# Altium integrated library EDD.IntLib: 140 symbols (continued)
## LN5674_11_M1
designator LCD?, comment LN5674  (value not drawn)
footprint LN5674 (Footprint not found)
pins: 1 e, 2 d, 3 DP, 4 c, 5 g, 6 Digit4, 7 b, 8 Digit3, 9 Digit2, 10 f, 11 a, 12 Digit1

## M24LR04E-R
designator U?
footprint SOIC8
pins: 1 Vout, 2 AC0, 3 AC1, 4 VSS (power), 5 SDA (io), 6 SCL (in), 7 RF WIP/Busy (out), 8 VCC (power)

## MAX3232
designator U?, comment MAX3232 CONVERTER
MAX3232
footprint SOT95P280X145-6N (Footprint not found)
pins: 1 C1+ (power), 2 V+ (power), 3 C1- (power), 4 C2+ (power), 5 C2- (power), 6 V- (power), 7 DOUT2 (power), 8 RIN2 (power), 9 ROUT2 (power), 10 DIN2 (power), 11 DIN1 (power), 12 ROUT1 (power), 13 RIN1 (power), 14 DOUT1 (power), 15 GND (power), 16 VCC (power)

## MC-ARM-STM32F101-SQ144
designator U?
footprint LQFP144_N (Thin QFP, 144-Leads, Body 20x20mm, Pitch 0.5mm, IPC Medium Density)
part A pins: 1 PE2 (io), 2 PE3 (io), 3 PE4 (io), 4 PE5 (io), 5 PE6 (io), 7 PC13-TAMPER-RTC (io), 8 PC14-OSC32_IN (io), 9 PC15-OSC32_OUT (io), 10 PF0 (io), 11 PF1 (io), 12 PF2 (io), 13 PF3 (io), 14 PF4 (io), 15 PF5 (io), 18 PF6 (io), 19 PF7 (io), 20 PF8 (io), 21 PF9 (io), 22 PF10 (io), 23 OSC_IN (in), 24 OSC_OUT (out), 25 NRST (io), 26 PC0 (io), 27 PC1 (io), 28 PC2 (io), 29 PC3 (io), 34 PA0-WKUP (io), 35 PA1 (io), 36 PA2 (io), 37 PA3 (io), 40 PA4 (io), 41 PA5 (io), 42 PA6 (io), 43 PA7 (io), 44 PC4 (io), 45 PC5 (io), 46 PB0 (io), 47 PB1 (io), 48 PB2 (io), 49 PF11 (io), 50 PF12 (io), 53 PF13 (io), 54 PF14 (io), 55 PF15 (io), 56 PG0 (io), 57 PG1 (io), 58 PE7 (io), 59 PE8 (io), 60 PE9 (io), 63 PE10 (io), 64 PE11 (io), 65 PE12 (io), 66 PE13 (io), 67 PE14 (io), 68 PE15 (io), 69 PB10 (io), 70 PB11 (io), 73 PB12 (io), 74 PB13 (io), 75 PB14 (io), 76 PB15 (io), 77 PD8 (io), 78 PD9 (io), 79 PD10 (io), 80 PD11 (io), 81 PD12 (io), 82 PD13 (io), 85 PD14 (io), 86 PD15 (io), 87 PG2 (io), 88 PG3 (io), 89 PG4 (io), 90 PG5 (io), 91 PG6 (io), 92 PG7 (io), 93 PG8 (io), 96 PC6 (io), 97 PC7 (io), 98 PC8 (io), 99 PC9 (io), 100 PA8 (io), 101 PA9 (io), 102 PA10 (io), 103 PA11 (io), 104 PA12 (io), 105 PA13 (io), 109 PA14 (io), 110 PA15 (io), 111 PC10 (io), 112 PC11 (io), 113 PC12 (io), 114 PD0 (io), 115 PD1 (io), 116 PD2 (io), 117 PD3 (io), 118 PD4 (io), 119 PD5 (io), 122 PD6 (io), 123 PD7 (io), 124 PG9 (io), 125 PG10 (io), 126 PG11 (io), 127 PG12 (io), 128 PG13 (io), 129 PG14 (io), 132 PG15 (io), 133 PB3 (io), 134 PB4 (io), 135 PB5 (io), 136 PB6 (io), 137 PB7 (io), 138 BOOT0 (in), 139 PB8 (io), 140 PB9 (io), 141 PE0 (io), 142 PE1 (io)
part B pins: 6 VBAT (power), 16 VSS_5 (power), 17 VDD_5 (power), 30 VSSA (power), 31 VREF- (power), 32 VREF+ (power), 33 VDDA (power), 38 VSS_4 (power), 39 VDD_4 (power), 51 VSS_6 (power), 52 VDD_6 (power), 61 VSS_7 (power), 62 VDD_7 (power), 71 VSS_1 (power), 72 VDD_1 (power), 83 VSS_8 (power), 84 VDD_8 (power), 94 VSS_9 (power), 95 VDD_9 (power), 106 NC, 107 VSS_2 (power), 108 VDD_2 (power), 120 VSS_10 (power), 121 VDD_10 (power), 130 VSS_11 (power), 131 VDD_11 (power), 143 VSS_3 (power), 144 VDD_3 (power)

## Micro SD card holder
designator P?
LatestRevisionDate: 17-Jul-2002; LatestRevisionNote: Re-released for DXP Platform.; Publisher: Altium Limited
footprint SD 503182-077 (Footprint not found)
pins: 1 Data2, 2 Data3, 3 CMD, 4 VDD, 5 CLK, 6 VSS, 7 Data0, 8 Data1, 9 Card Detect, 10 SW Term

## MJD31C
designator Q1
ParentPart: Value; StockCode: 0605; StockCode: 0132
footprint D-PAK (Footprint not found)
pins: 1, 2, 3

## MMBT2222LT1
designator Q?
General Purpose Transistor NPN Silicon; Manufacturer: Motorola; Class: Discrete; SubClass: BJT - Low Power; Code: PPF200; Published: 29/09/2000; Publisher: Altium Hobart Technology Centre
footprint SO-G3/C2.5
pins: 1 B, 2 E, 3 C

## Multiturn Pot
designator VR?
Potentiometer; Code: 100K PIHER POT; Stock Code: PIHER; Price: 2.68
footprint Multiturn Pot (Footprint not found)
pins: 1, 2, 3 W

## NT90 Relay -SPST
designator K?, comment NT90 Relay
Single-Pole Single-Throw Relay; Published: 24-Mar-1999; Revision: July-2002: Re-released for DXP Platform.; Publisher: Altium Limited
footprint NT90 Relay (Relay 20A)
pins: 1, 2, 3, 4, 5

## PIC12LF1822-E/SN
designator U?
FLASH-Based 8-Bit CMOS Microcontroller, 10-Bit A/D, 8-Pin SOIC 150mil, Extended Temperature; Note: Refer to data sheet (DS41190F) for details of supply voltage range under different conditions.; Published: 11-Oct-2004; LatestRevisionDate: 02-Dec-2009; LatestRevisionNote: Updated to datasheet revision revF, Sep-2009.; DatasheetVersion: revF, Sep-2009; PackageVersion: revBB, Aug-2009; PackageReference: SOIC-SN8; Publisher: Altium Limited; PackageDescription: 8-Lead Plastic Small Outline (SN) - Narrow, 3.90mm Body [SOIC]; Supplier 1: Digi-Key; Supplier Part Number 1: PIC12F675-E/SN-ND; Code_JEDEC: MS-012; Code_IPC: SOIC127P600-8; ComponentLink1Description: Datasheet; ComponentLink1URL: http://ww1.microchip.com/downloads/en/DeviceDoc/41190F.pdf; ComponentLink2Description: Packaging Specification; ComponentLink2URL: http://www.microchip.com/stellent/groups/techpub_sg/documents/packagingspec/en012702.pdf; ComponentLink3Description: Microchip.com Home; ComponentLink3URL: http://www.microchip.com/
footprint SOIC8
pins: 1 VDD (power), 2 RX/DT/CCP1/P1A/SRNQ/T1CKI/T1OSI/OSC1/CLKIN/RA5 (io), 3 MDCIN2/T1G/P1B/TX/CK/SDO/CLKR/C1IN1-/T1OSO/CLKOUT/OSC2/CPS3/AN3/RA4 (io), 4 MCLR/VPP/T1G/SS/RA3 (io), 5 RA2/AN2/CPS2/C1OUT/SRQ/T0CKI/CCP1/P1A/FLT0/SDA/SDI/INT/MDCIN1 (io), 6 RA1/AN1/CPS1/VREF/C1IN0-/SRI/RX/DT/SCL/SCK/MDMIN/ICSPCLK (io), 7 RA0/AN0/CPS0/C1IN+/DACOUT/TX/CK/SDO/SS/P1B/MDOUT/ICSPDAT (io), 8 VSS (power)

## PIC16LF1823-E/SN
designator U?
footprint SOIC14 (Footprint not found)
pins: 1 VDD, 2 T1CKI/T1OSI/OSC1/CLKIN/RA5, 3 T1G(1)/SDO(1)/CLKR/T1OSO/CLKOUT/OSC2/CPS3/AN3/RA4, 4 MCLR/VPP/T1G(1)/SS(1)/RA3, 5 MDCIN2/RX(1)/DT(1)/CCP1/P1A/RC5, 6 MDOUT/TX(1)/CK(1)/P1B/SRNQ/C2OUT/RC4, 7 MDMIN/SS(1)/P1C/C12IN3-/CPS7/AN7/RC3, 8 RC2/AN6/CPS6/C12IN2-/P1D/SDO(1)/MDCIN1, 9 RC1/AN5/CPS5/C12IN1-/SDA/SDI, 10 RC0/AN4/CPS4/C2IN+/SCL/SCK, 11 RA2/AN2/CPS2/T0CKI/INT/C1OUT/SRQ/FLT0, 12 RA1/AN1/CPS1/C12IN0-/VREF/SRI/RX(1)/DT(1)/ICSPCLK, 13 RA0/AN0/CPS0/C1IN+/DACOUT/TX(1)/CK(1)/ICSPDAT/ICDDAT, 14 VSS

## PM-BM-MCP73831-SOT5
designator U?
pins: 1 STAT (out), 2 VSS (power), 3 VBAT (power), 4 VDD (power), 5 PROG

## PM-SWREG-STLD40D-IL9
designator U?
footprint QFN8_V (SON, 8-Leads, Body 3x3mm, Pitch 0.65mm, Thermal Pad 2.74x2mm, ST Recommended)
pins: 1 VI (power), 2 RSET (in), 3 GND (power), 4 FB, 5 NC, 6 VO (out), 7 EN (in), 8 SW (oc), 9 PGND (power)

## POT 3224 SMT Bourns
designator VR?, comment 100k
Potentiometer; Code: DNF
footprint POT 3224 SMD (Bourns SMD POT)
pins: 1, 2, 3

## PT10NH05
designator VR4, comment 100K PIHER POT
Potentiometer; Stock Code: PIHER; Price: 2.68; Code: 100K PIHER POT
footprint PT10NH01 (PT10 Piher Pot)
pins: 1, 2, 3 W

## PT15NH05
designator VR4, comment 100K PIHER POT
Potentiometer; Stock Code: PIHER; Price: 2.68; Code: 100K PIHER POT
footprint PT15NH05 (Footprint not found)
pins: 1, 2, 3 W

## Res2
designator R?, comment 1k2
Resistor; Code: BLC250; Published: 8-Jun-2000; Revision: July-2002: Re-released for DXP Platform.; Publisher: Altium Limited
footprint AXIAL-0.4 (Axial Device, Thru-Hole; 2 Leads; 0.4 in Pin Spacing)
footprint 0603
footprint 1206
footprint AXIAL-0.8 (Footprint not found)
footprint AXIAL-0.6 (Footprint not found)
footprint RESC0402(1005)_L (Chip Resistor, Body 1.0x0.5mm, IPC High Density)
footprint 1206d
pins: 1, 2
1 alternate drawing of the same symbol

## Res Varistor
designator RV?, comment DNF
Varistor (Voltage-Sensitive Resistor); Published: 24-Mar-1999; LatestRevisionDate: 4-Mar-2005; LatestRevisionNote: PCB Footprint replaced.; Publisher: Altium Limited; Code: DNF
footprint 4527
pins: 1, 2

## Resonator CSTCC-G
designator RS1
footprint CSTCC-G Resonator (SMD Resonator)
pins: 1, 2 GND (power), 3

## Resonator ZTTCS MX
designator RS1
footprint Resonator ZTTCS MX (SMD Resonator)
pins: 1, 2 GND (power), 3

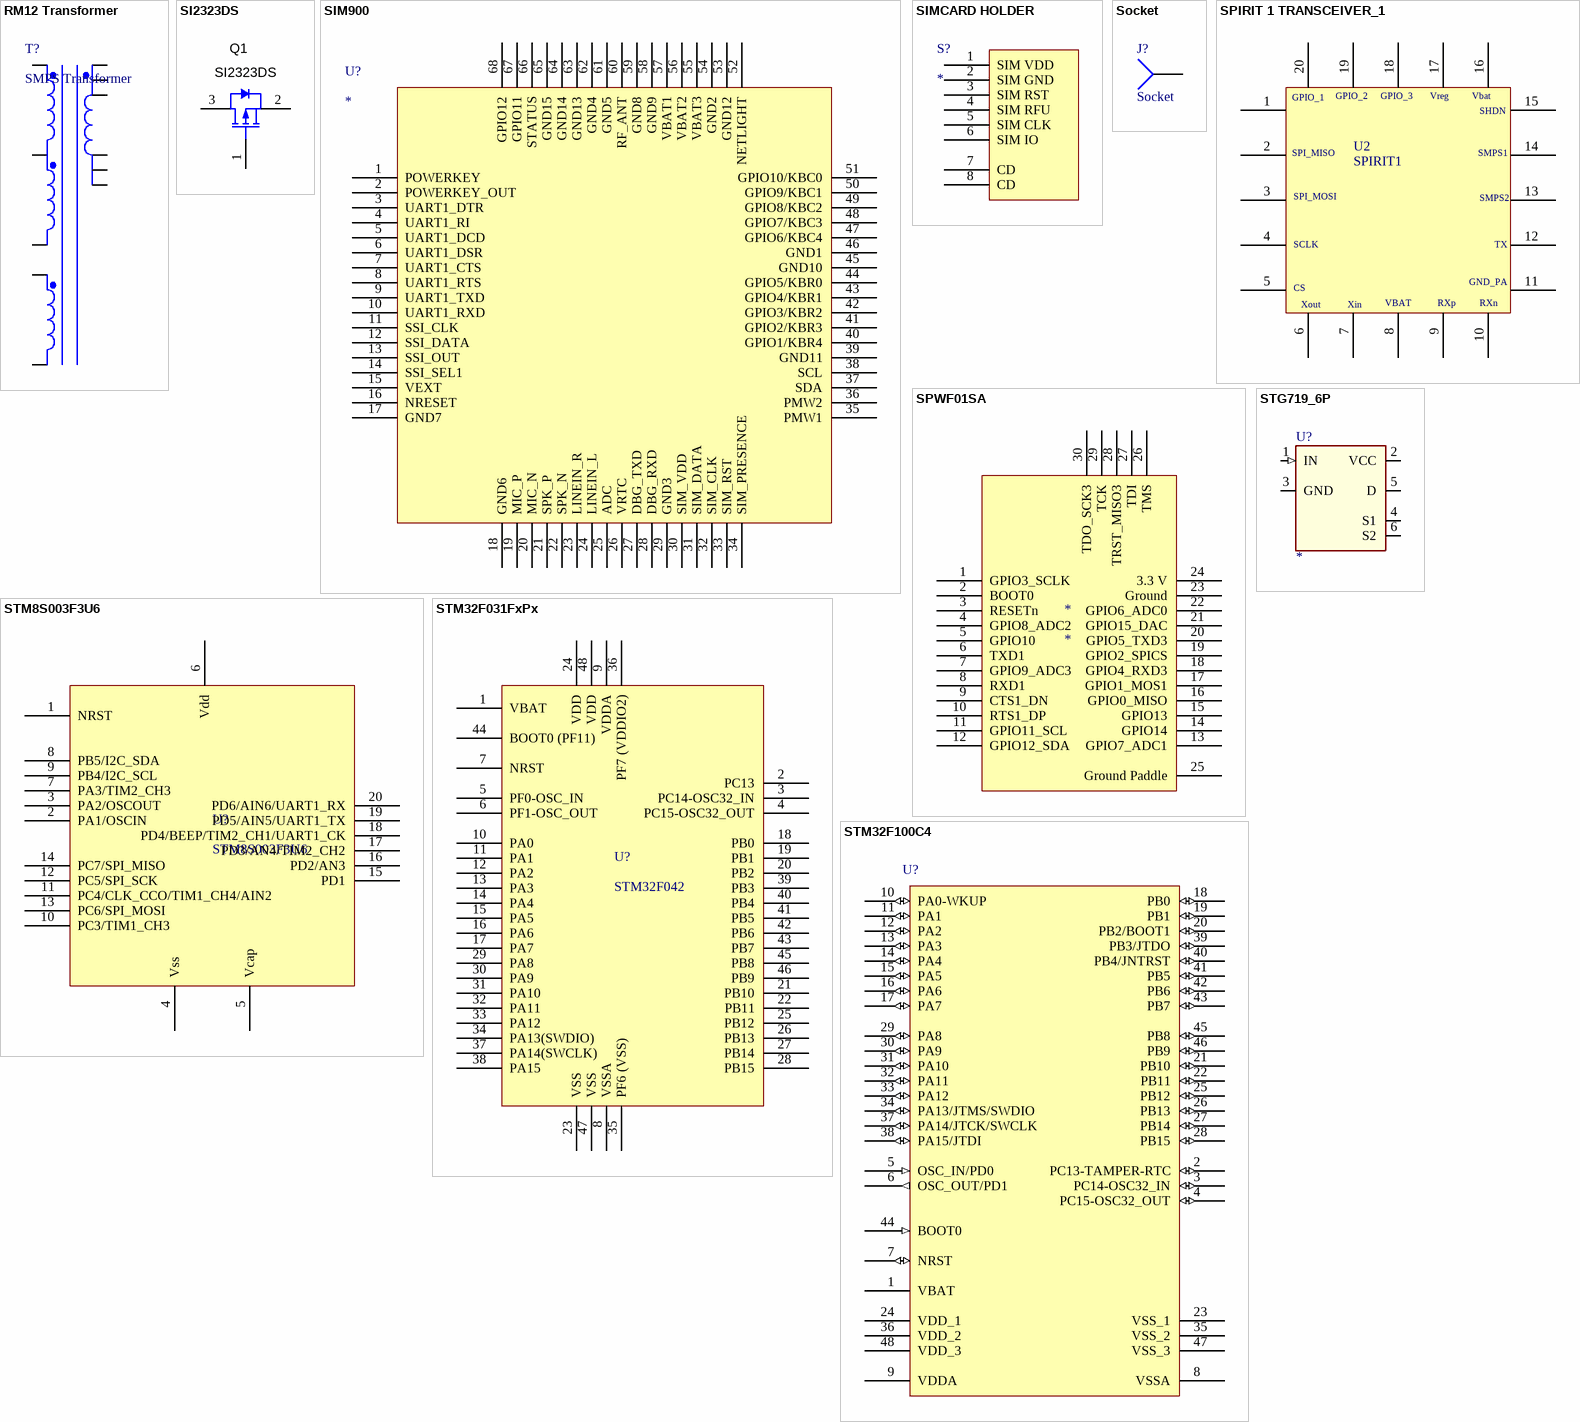
[diagram p3: symbols RM12 Transformer to STM32F100C4]

## RM12 Transformer
designator T?, comment SMPS Transformer
RM12 transformer
footprint RM12 Transformer
pins: 1 Pri-, 2 Pri-, 3 Pri+, 4 Sec-, 5 Sec-, 6 Sec-, 7 Sec+, 8 Sec+, 9 Sec+, 11 Aux+, 12 Aux-

## SI2323DS
designator Q1
MOSFET, P-CH, -20 V, -3.7 A, SOT-23; Manufacturer: Vishay-Siliconix; Alternate Manufacturer: None; U/M: EA; ChType: P; Value: -20V; Value1: 0.031 ohm; Rdson45_ohm: 0.031; Value2: 12.5 nC; QgTyp_nC: 12.5; Vgs_V: -8; AEC Category: Q101; SymbolVersion: 2008-07-09; PartNumber: SI2323DS; PackageReference: SOT-23; CompType: MOSFET; VdsMax_V: -20; IdsMax_A: -3.7; RoHS: Y; MountType: SMT; Published: 2008-06-19; Publisher: Texas Instruments; LatestRevisionDate: 2015-11-11; LatestRevisionNote: Added parts.; ComponentLink1Description: Datasheet link; ComponentLink1URL: http://www.vishay.com/docs/72024/72024.pdf; AEC Qualified: ?
footprint SOT-23
footprint SOT-23M
footprint SOT-23L
simulation model Si2323DS
footprint SOT-23 (SOT23, 3-Leads, Body 2.9x1.3mm, Pitch 0.95mm, Lead Span 2.5mm, IPC Medium Density)
pins: 1 G, 2 S, 3 D

## SIM900
designator U?
footprint SIM900 (Footprint not found)
pins: 1 POWERKEY, 2 POWERKEY_OUT, 3 UART1_DTR, 4 UART1_RI, 5 UART1_DCD, 6 UART1_DSR, 7 UART1_CTS, 8 UART1_RTS, 9 UART1_TXD, 10 UART1_RXD, 11 SSI_CLK, 12 SSI_DATA, 13 SSI_OUT, 14 SSI_SEL1, 15 VEXT, 16 NRESET, 17 GND7, 18 GND6, 19 MIC_P, 20 MIC_N, 21 SPK_P, 22 SPK_N, 23 LINEIN_R, 24 LINEIN_L, 25 ADC, 26 VRTC, 27 DBG_TXD, 28 DBG_RXD, 29 GND3, 30 SIM_VDD, 31 SIM_DATA, 32 SIM_CLK, 33 SIM_RST, 34 SIM_PRESENCE, 35 PMW1, 36 PMW2, 37 SDA, 38 SCL, 39 GND11, 40 GPIO1/KBR4, 41 GPIO2/KBR3, 42 GPIO3/KBR2, 43 GPIO4/KBR1, 44 GPIO5/KBR0, 45 GND10, 46 GND1, 47 GPIO6/KBC4, 48 GPIO7/KBC3, 49 GPIO8/KBC2, 50 GPIO9/KBC1, 51 GPIO10/KBC0, 52 NETLIGHT, 53 GND12, 54 GND2, 55 VBAT3, 56 VBAT2, 57 VBAT1, 58 GND9, 59 GND8, 60 RF_ANT, 61 GND5, 62 GND4, 63 GND13, 64 GND14, 65 GND15, 66 STATUS, 67 GPIO11, 68 GPIO12

## SIMCARD HOLDER
designator S?
footprint SIMCARD HOLDER (Footprint not found)
pins: 1 SIM VDD, 2 SIM GND, 3 SIM RST, 4 SIM RFU, 5 SIM CLK, 6 SIM IO, 7 CD, 8 CD

## Socket
designator J?
LatestRevisionDate: 17-Jul-2002; LatestRevisionNote: Re-released for DXP Platform.; Publisher: Altium Limited; Code: Socket
footprint PIN1 (Connector; Socket)
signal-integrity model Connector
pins: 1

## SPIRIT 1 TRANSCEIVER_1
designator U2, comment SPIRIT1
Low data rate, low power Sub 1GHz transceiver
footprint QFN50P400X400X100_HS-21N (QFN, 20-Leads, Body 4.00x4.00mm, Pitch 0.50mm, Thermal Pad 2.60x2.60mm, IPC Medium Density)
pins: 1 GPIO_0, 2 GPIO_1, 3 GPIO_2, 4 GPIO_3, 5 GPIO_3, 6 VREG, 7 VREG, 8 VREG, 9 VREG, 10 VREG, 11 TX, 12 TX, 13 TX, 14 TX, 15 TX, 16 VBAT2, 17 VBAT2, 18 VBAT2, 19 VBAT2, 20 VBAT2, 21 hidden to GND
text: Vreg; Vbat; SHDN; SPI_MISO; SMPS1; SPI_MOSI; SMPS2; SCLK; GND_PA; CS; Xout; Xin; VBAT; RXp; RXn

## SPWF01SA
designator *
footprint SPWF01SA (Serial to WiFI Module)
pins: 1 GPIO3_SCLK, 2 BOOT0, 3 RESETn, 4 GPIO8_ADC2, 5 GPIO10, 6 TXD1, 7 GPIO9_ADC3, 8 RXD1, 9 CTS1_DN, 10 RTS1_DP, 11 GPIO11_SCL, 12 GPIO12_SDA, 13 GPIO7_ADC1, 14 GPIO14, 15 GPIO13, 16 GPIO0_MISO, 17 GPIO1_MOS1, 18 GPIO4_RXD3, 19 GPIO2_SPICS, 20 GPIO5_TXD3, 21 GPIO15_DAC, 22 GPIO6_ADC0, 23 Ground, 24 3.3 V, 25 Ground Paddle, 26 TMS, 27 TDI, 28 TRST_MISO3, 29 TCK, 30 TDO_SCK3

## STG719_6P
designator U?
footprint SOT95P280X145-6N (Footprint not found)
pins: 1 IN (in), 2 VCC (power), 3 GND (power), 4 S1 (io), 5 D (io), 6 S2 (io)

## STM8S003F3U6
designator U?
footprint QFN50P300X300X55-20L (Footprint not found)
pins: 1 NRST, 2 PA1/OSCIN, 3 PA2/OSCOUT, 4 Vss, 5 Vcap, 6 Vdd, 7 PA3/TIM2_CH3, 8 PB5/I2C_SDA, 9 PB4/I2C_SCL, 10 PC3/TIM1_CH3, 11 PC4/CLK_CCO/TIM1_CH4/AIN2, 12 PC5/SPI_SCK, 13 PC6/SPI_MOSI, 14 PC7/SPI_MISO, 15 PD1, 16 PD2/AN3, 17 PD3/AN4/TIM2_CH2, 18 PD4/BEEP/TIM2_CH1/UART1_CK, 19 PD5/AIN5/UART1_TX, 20 PD6/AIN6/UART1_RX

## STM32F031FxPx
designator U?, comment STM32F042
ARM®-based 32-bit MCU, up to 32 KB Flash
footprint LQFP48_M (Thin QFP, 48-Leads, Body 7x7mm, Pitch 0.5mm, IPC Low Density)
pins: 1 VBAT, 2 PC13, 3 PC14-OSC32_IN, 4 PC15-OSC32_OUT, 5 PF0-OSC_IN, 6 PF1-OSC_OUT, 7 NRST, 8 VSSA, 9 VDDA, 10 PA0, 11 PA1, 12 PA2, 13 PA3, 14 PA4, 15 PA5, 16 PA6, 17 PA7, 18 PB0, 19 PB1, 20 PB2, 21 PB10, 22 PB11, 23 VSS, 24 VDD, 25 PB12, 26 PB13, 27 PB14, 28 PB15, 29 PA8, 30 PA9, 31 PA10, 32 PA11, 33 PA12, 34 PA13(SWDIO), 35 PF6 (VSS), 36 PF7 (VDDIO2), 37 PA14(SWCLK), 38 PA15, 39 PB3, 40 PB4, 41 PB5, 42 PB6, 43 PB7, 44 BOOT0 (PF11), 45 PB8, 46 PB9, 47 VSS, 48 VDD

## STM32F100C4
designator U?
STM32 ARM-based 32-bit MCU with 32 Kbytes Flash, 48-pin LQFP, Industrial Temperature; Published: 30-May-2008; DatasheetVersion: rev6, Mar-2008; PackageVersion: Mar-2008; PackageReference: LQFP48; Publisher: Altium Limited; PackageDescription: 48-Pin Low-Profile Quad Flat Pack, 7 x 7 mm Body, 0.5 mm Pitch (LQFP48); ComponentLink1Description: Manufacturer Link; ComponentLink1URL: www.st.com/stm32; ComponentLink2Description: Datasheet; ComponentLink2URL: http://www.st.com/stonline/products/literature/ds/13586.pdf
footprint LQFP48_N (Thin QFP, 48-Leads, Body 7x7mm, Pitch 0.5mm, IPC Medium Density)
footprint LQFP48_L (Thin QFP, 48-Leads, Body 7x7mm, Pitch 0.5mm, IPC High Density)
footprint LQFP48_M (Thin QFP, 48-Leads, Body 7x7mm, Pitch 0.5mm, IPC Low Density)
pins: 1 VBAT (power), 2 PC13-TAMPER-RTC (io), 3 PC14-OSC32_IN (io), 4 PC15-OSC32_OUT (io), 5 OSC_IN/PD0 (in), 6 OSC_OUT/PD1 (out), 7 NRST (io), 8 VSSA (power), 9 VDDA (power), 10 PA0-WKUP (io), 11 PA1 (io), 12 PA2 (io), 13 PA3 (io), 14 PA4 (io), 15 PA5 (io), 16 PA6 (io), 17 PA7 (io), 18 PB0 (io), 19 PB1 (io), 20 PB2/BOOT1 (io), 21 PB10 (io), 22 PB11 (io), 23 VSS_1 (power), 24 VDD_1 (power), 25 PB12 (io), 26 PB13 (io), 27 PB14 (io), 28 PB15 (io), 29 PA8 (io), 30 PA9 (io), 31 PA10 (io), 32 PA11 (io), 33 PA12 (io), 34 PA13/JTMS/SWDIO (io), 35 VSS_2 (power), 36 VDD_2 (power), 37 PA14/JTCK/SWCLK (io), 38 PA15/JTDI (io), 39 PB3/JTDO (io), 40 PB4/JNTRST (io), 41 PB5 (io), 42 PB6 (io), 43 PB7 (io), 44 BOOT0 (in), 45 PB8 (io), 46 PB9 (io), 47 VSS_3 (power), 48 VDD_3 (power)

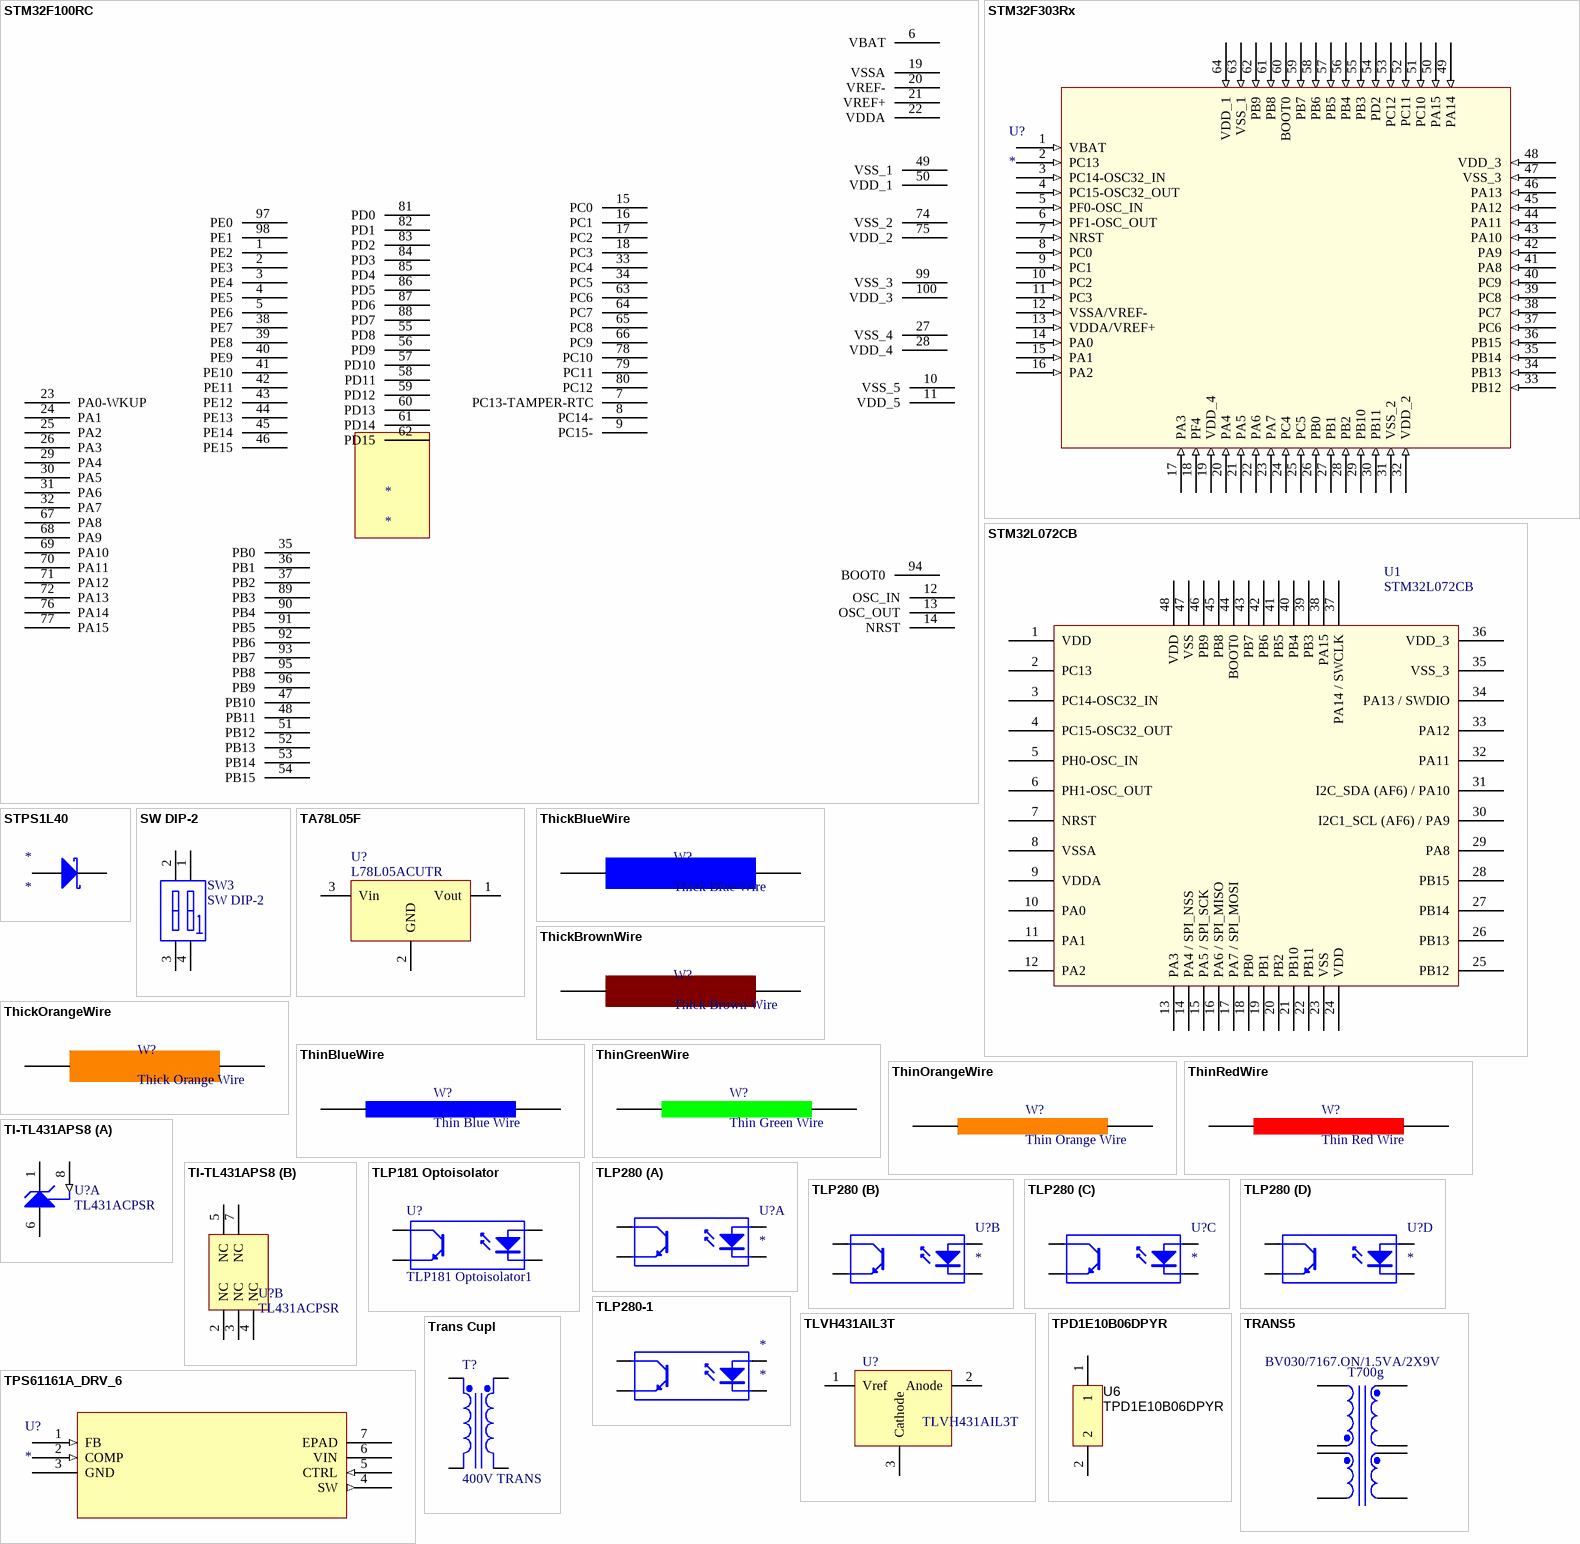
[diagram p4: symbols STM32F100RC to Trans Cupl]

## STM32F100RC
designator *
pins: 1 PE2, 2 PE3, 3 PE4, 4 PE5, 5 PE6, 6 VBAT, 7 PC13-TAMPER-RTC, 8 PC14-, 9 PC15-, 10 VSS_5, 11 VDD_5, 12 OSC_IN, 13 OSC_OUT, 14 NRST, 15 PC0, 16 PC1, 17 PC2, 18 PC3, 19 VSSA, 20 VREF-, 21 VREF+, 22 VDDA, 23 PA0-WKUP, 24 PA1, 25 PA2, 26 PA3, 27 VSS_4, 28 VDD_4, 29 PA4, 30 PA5, 31 PA6, 32 PA7, 33 PC4, 34 PC5, 35 PB0, 36 PB1, 37 PB2, 38 PE7, 39 PE8, 40 PE9, 41 PE10, 42 PE11, 43 PE12, 44 PE13, 45 PE14, 46 PE15, 47 PB10, 48 PB11, 49 VSS_1, 50 VDD_1, 51 PB12, 52 PB13, 53 PB14, 54 PB15, 55 PD8, 56 PD9, 57 PD10, 58 PD11, 59 PD12, 60 PD13, 61 PD14, 62 PD15, 63 PC6, 64 PC7, 65 PC8, 66 PC9, 67 PA8, 68 PA9, 69 PA10, 70 PA11, 71 PA12, 72 PA13, 74 VSS_2, 75 VDD_2, 76 PA14, 77 PA15, 78 PC10, 79 PC11, 80 PC12, 81 PD0, 82 PD1, 83 PD2, 84 PD3, 85 PD4, 86 PD5, 87 PD6, 88 PD7, 89 PB3, 90 PB4, 91 PB5, 92 PB6, 93 PB7, 94 BOOT0, 95 PB8, 96 PB9, 97 PE0, 98 PE1, 99 VSS_3, 100 VDD_3

## STM32F303Rx
designator U?
footprint TSQFP50P1200X1200X160-64N (TSQFP, 64-Leads, Body 10.00x10.00mm, Pitch 0.50mm, IPC Medium Density)
pins: 1 VBAT (in), 2 PC13 (in), 3 PC14-OSC32_IN (in), 4 PC15-OSC32_OUT (in), 5 PF0-OSC_IN (in), 6 PF1-OSC_OUT (in), 7 NRST (in), 8 PC0 (in), 9 PC1 (in), 10 PC2 (in), 11 PC3 (in), 12 VSSA/VREF- (in), 13 VDDA/VREF+ (in), 14 PA0 (in), 15 PA1 (in), 16 PA2 (in), 17 PA3 (in), 18 PF4 (in), 19 VDD_4 (in), 20 PA4 (in), 21 PA5 (in), 22 PA6 (in), 23 PA7 (in), 24 PC4 (in), 25 PC5 (in), 26 PB0 (in), 27 PB1 (in), 28 PB2 (in), 29 PB10 (in), 30 PB11 (in), 31 VSS_2 (in), 32 VDD_2 (in), 33 PB12 (in), 34 PB13 (in), 35 PB14 (in), 36 PB15 (in), 37 PC6 (in), 38 PC7 (in), 39 PC8 (in), 40 PC9 (in), 41 PA8 (in), 42 PA9 (in), 43 PA10 (in), 44 PA11 (in), 45 PA12 (in), 46 PA13 (in), 47 VSS_3 (in), 48 VDD_3 (in), 49 PA14 (in), 50 PA15 (in), 51 PC10 (in), 52 PC11 (in), 53 PC12 (in), 54 PD2 (in), 55 PB3 (in), 56 PB4 (in), 57 PB5 (in), 58 PB6 (in), 59 PB7 (in), 60 BOOT0 (in), 61 PB8 (in), 62 PB9 (in), 63 VSS_1 (in), 64 VDD_1 (in)

## STM32L072CB
designator U1
footprint LQFP48_M (Thin QFP, 48-Leads, Body 7x7mm, Pitch 0.5mm, IPC Low Density)
pins: 1 VDD, 2 PC13, 3 PC14-OSC32_IN, 4 PC15-OSC32_OUT, 5 PH0-OSC_IN, 6 PH1-OSC_OUT, 7 NRST, 8 VSSA, 9 VDDA, 10 PA0, 11 PA1, 12 PA2, 13 PA3, 14 PA4 / SPI_NSS, 15 PA5 / SPI_SCK, 16 PA6 / SPI_MISO, 17 PA7 / SPI_MOSI, 18 PB0, 19 PB1, 20 PB2, 21 PB10, 22 PB11, 23 VSS, 24 VDD, 25 PB12, 26 PB13, 27 PB14, 28 PB15, 29 PA8, 30 I2C1_SCL (AF6) / PA9, 31 I2C_SDA (AF6) / PA10, 32 PA11, 33 PA12, 34 PA13 / SWDIO, 35 VSS_3, 36 VDD_3, 37 PA14 / SWCLK, 38 PA15, 39 PB3, 40 PB4, 41 PB5, 42 PB6, 43 PB7, 44 BOOT0, 45 PB8, 46 PB9, 47 VSS, 48 VDD

## STPS1L40
designator *
footprint STmite flat
footprint SMA (Molded Diode, 2-Leads, Body 5.07x2.57mm, IPC High Density)
pins: 1 A, 2 K

## SW DIP-2
designator SW3
DIP Switch; Code: EFB180; Stock Code: EFB180; Price: 2.26
footprint SW-DIP4 (Two way Piano Dip switch)
pins: 1 A1, 2 A2, 3 B2, 4 B1

## TA78L05F
designator U?, comment L78L05ACUTR
Surface mount regulator; Code: RPT100
footprint SOT89
footprint TO-220-AB (TO, Thru-Hole, Vertical, Heatsink Mounted; 3 In-Line Leads; Pitch 2.54 mm)
pins: 1 Vout, 2 GND, 3 Vin

## ThickBlueWire
designator W?, comment Thick Blue Wire  (mechanical)

## ThickBrownWire
designator W?, comment Thick Brown Wire  (net tie)

## ThickOrangeWire
designator W?, comment Thick Orange Wire  (net tie)

## ThinBlueWire
designator W?, comment Thin Blue Wire  (net tie)

## ThinGreenWire
designator W?, comment Thin Green Wire  (net tie)

## ThinOrangeWire
designator W?, comment Thin Orange Wire  (net tie)

## ThinRedWire
designator W?, comment Thin Red Wire  (mechanical)

## TI-TL431APS8
designator U?, comment TL431ACPSR
Adjustable Precision Shunt Regulator, 34 ppm / degC, 100 mA, 0 to 70 degC, 8-pin SO (PS), Green (RoHS & no Sb/Br); Manufacturer: Texas Instruments; Temp Coeff(Typ)(ppm/ degree C): 34; Temp Coeff(Max)(ppm/ degree C): 92; VO Adj(Min)(V): 2.495; VO Adj(Max)(V): 36; Initial Accuracy @ 25/deg C(%): 1; Min Iz for Regulation(uA): 600; Rating: Catalog; SubFamily: Shunt Voltage Reference; Iout/Iz(Max)(mA): 100; PartNumber: TL431ACPSR; Eco-Plan: Green (RoHS & no Sb/Br); ComponentLink2Description: Datasheet; PackageDescription: 8-Pin Plastic Small Outline, Body 6.2 x 5.3 mm, 1.27 mm Pitch; ComponentLink1URL: http://www.ti.com/; PackageReference: PS8; Mounting Technology: Surface Mount; ComponentLink2URL: http://www.ti.com/general/docs/lit/getliterature.tsp?genericPartNumber=TL431A&fileType=pdf; ComponentLink1Description: Manufacturer URL; ComponentLink3URL: http://www.ti.com/litv/pdf/msop001a; ComponentLink3Description: Package Specification; DatasheetVersion: SLVS543M
footprint SOIC8
part A pins: 1 CATHODE, 6 ANODE, 8 REF (in)
part B pins: 2 NC "No internal connection", 3 NC "No internal connection", 4 NC "No internal connection", 5 NC "No internal connection", 7 NC "No internal connection"

## TLP181 Optoisolator
designator U?, comment TLP181 Optoisolator1
4-Pin Phototransistor Optocoupler TOSHIBA; Unit P: 1.20; Published: 24-Mar-1999; LatestRevisionDate: 4-Mar-2005; LatestRevisionNote: Sch pins 3 & 4 Swapped.; DatasheetDocument: Nov-2003; PackageReference: DIP-4; Publisher: Altium Limited; Supplier1 code: 35M0233; Supplier1: Mantech
footprint DIP-4 (DIP; 4 Leads; Row Spacing 7.62 mm; Pitch 2.54 mm)
footprint TLP181
pins: 1 A "Anode", 2 K "Cathode", 3 E "Emitter", 4 C "Collector"

## TLP280
designator U?
footprint SOIC127P690X210-16N (Footprint not found)
part A pins: 1 A "Anode", 2 K "Cathode", 15 E "Emitter", 16 C "Collector"
part B pins: 3 A "Anode", 4 K "Cathode", 13 E "Emitter", 14 C "Collector"
part C pins: 5 A "Anode", 6 K "Cathode", 11 E "Emitter", 12 C "Collector"
part D pins: 7 A "Anode", 8 K "Cathode", 9 E "Emitter", 10 C "Collector"

## TLP280-1
designator *
footprint SOIC127P690X210-4N (SOIC, 4-Leads, Body 2.25x4.40mm, Pitch 1.27mm, IPC Medium Density)
pins: 1 A "Anode", 2 K "Cathode", 3 E "Emitter", 4 C "Collector"

## TLVH431AIL3T
designator U?
2.5V Voltage Reference, 3-Pin SOT-23, Industrial Temperature, Tape and Reel; Published: 29-Jan-2009; DatasheetVersion: revB, Feb-2005; PackageVersion: revAW, Oct-2008; PackageReference: SOT-23-TT3; Publisher: Altium Limited; PackageDescription: 3-Lead Plastic Small Outline Transistor (TT) [SOT-23]; Code_IPC: SOT23-3; ComponentLink1Description: Manufacturer Link; ComponentLink1URL: http://www.microchip.com; ComponentLink2Description: Datasheet; ComponentLink2URL: http://ww1.microchip.com/downloads/en/DeviceDoc/21653b.pdf; ComponentLink3Description: Packaging Specification; ComponentLink3URL: http://ww1.microchip.com/downloads/en/PackagingSpec/00049AW.pdf
footprint SO-G3/C2.5
pins: 1 Vref (power), 2 Anode (power), 3 Cathode (power)

## TPD1E10B06DPYR
designator U6
ESD in 0402 Package with 10 pF Capacitance and 6 V Breakdown, 1 Channel, -40 to +125 degC, 2-pin X2SON (DPY), Green (RoHS & no Sb/Br); Manufacturer: Texas Instruments; Alternate Manufacturer: None; Alternate PartNumber: Equivalent; Breakdown Voltage(Min)(V): 6; Eco-Plan: TBD; IEC 61000-4-2 Air-Gap(+/- kV): 30; IO Capacitance(Typ)(pF): 10; SubFamily: ESD Solution; DatasheetVersion: SLLSEB1; PackageVersion: revA, Apr-2010; PackageReference: DPY0002A; PackageDescription: 2-Pin Plastic Small Outline No-Lead 1.0 x 0.6 x 0.4 mm Body; Supplier 1: Digi-Key; Supplier Part Number 1: 296-30406-2-ND; Supplier 2: Digi-Key; Supplier Part Number 2: 296-30406-1-ND; Supplier 3: Digi-Key; Supplier Part Number 3: 296-30406-6-ND; Supplier 4: Newark; Supplier Part Number 4: 94T1842; Supplier 5: Mouser; Supplier Part Number 5: 595-TPD1E10B06DPYR; IEC 61000-4-2 Contact(+/- kV): 30; IO Leakage Current(nA): 10; MountType: SMT; PartNumber: TPD1E10B06DPYR; ComponentLink1Description: Datasheet; ComponentLink1URL: http://www.ti.com/general/docs/lit/getliterature.tsp?genericPartNumber=TPD1E10B06&fileType=pdf; ComponentLink2Description: URL Link1; ComponentLink2URL: SamplesURL:http://www.ti.com/product/tpd1e10b06#samples
footprint DPY0002A (R-PX2SON-N2)
pins: 1, 2

## TPS61161A_DRV_6
designator U?
Imported; MANUFACTURER_PART_NUMBER: tps61161a_drv_6; GENERIC_PART_NUMBER: TPS61161A; VENDOR: Texas Instruments; PACKAGE_DESIGNATOR: DRV; PIN_COUNT: 6; FAMILY_NAME: WHITE LED DRIVER; INDUSTRY_STD_PKG_TYPE: SON; Datasheet URL: http://www.ti.com/lit/gpn/TPS61161A; Manufacturer: Texas Instruments
footprint DRV6_1P6X1
pins: 1 FB (in), 2 COMP (in), 3 GND (power), 4 SW (out), 5 CTRL (in), 6 VIN (power), 7 EPAD

## TRANS5
designator T700g, comment BV030/7167.ON/1.5VA/2X9V
PartCategory: B; Code: CAF270; Company Code: 0803; Long Description: TRAFO/1.5VA/2X9V/83MA/EI30/12.5; AlternateKey2: CAF197; ProductClass: SR1; BulkIssueFlag: N; WarehouseToUse: A; Unit P: 13.8; Type: CON; Designator: T?; Price: 12.9; Part Number: BV030/7167.ON/1.5VA/2X9V; StockUom: EA; PriceCatewgory: A; Supplier1: AVNET; Supplier1 Code: CAF197; Pin Count: 6; Footprint: TRF_EI30_2; Value: BV030/7167.ON/1.5VA/2X9V; PackageReference: TRF_EI30_2
footprint TRF_EI30_2
footprint SMPS35 12
pins: 1, 2, 3, 4, 5, 6, 7, 8

## Trans Cupl
designator T?, comment 400V TRANS
Transformer (Coupled Inductor Model); Code: CAF270; Published: 8-Jun-2000; LatestRevisionDate: 17-Jul-2002; LatestRevisionNote: Re-released for DXP Platform.; Publisher: Altium Limited
footprint TRF_EI30_1
simulation model TRANSFORMER (Transformer)
pins: 1 Pri+, 2 Pri-, 3 Sec-, 4 Sec+

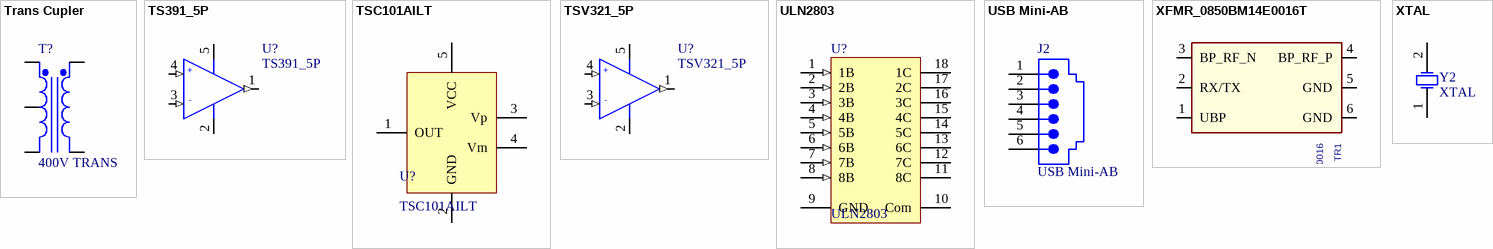
[diagram p5: symbols Trans Cupler to XTAL]

## Trans Cupler
designator T?, comment 400V TRANS
Transformer (Coupled Inductor Model); Code: CAF270; Published: 8-Jun-2000; LatestRevisionDate: 17-Jul-2002; LatestRevisionNote: Re-released for DXP Platform.; Publisher: Altium Limited
footprint ef12.6
simulation model TRANSFORMER (Transformer)
pins: 1 Pri1, 2 Pri2, 3 Pri3, 4 Sec3, 6 Sec1

## TS391_5P
designator U?
footprint SOT323-5L (SOT23, 6-Leads, Body 2.2x2.4mm (max), Pitch 0.65mm, IPC Medium Density)
footprint SOT95P280X145-5N (Footprint not found)
pins: 1 OUT (out), 2 VCC- (power), 3 -IN (in), 4 +IN (in), 5 VCC+ (power)
text: +; -

## TSC101AILT
designator U?
footprint SOT323-5L (SOT23, 6-Leads, Body 2.2x2.4mm (max), Pitch 0.65mm, IPC Medium Density)
footprint SOT95P280X145-5N (SOT23, 5-Leads, Body 2.90x2.80mm, Pitch 0.95mm, IPC Medium Density)
pins: 1 OUT, 2 GND, 3 Vp, 4 Vm, 5 VCC

## TSV321_5P
designator U?
footprint SOT323-5L (SOT23, 6-Leads, Body 2.2x2.4mm (max), Pitch 0.65mm, IPC Medium Density)
footprint SOT95P280X145-5N (Footprint not found)
pins: 1 OUT (out), 2 VCC- (power), 3 -IN (in), 4 +IN (in), 5 VCC+ (power)
text: +; -

## ULN2803
designator U?
High-Voltage, High-Current Darlington Transistor Array
footprint SOIC127P1030X265-18N (Footprint not found)
pins: 1 1B (in), 2 2B (in), 3 3B (in), 4 4B (in), 5 5B (in), 6 6B (in), 7 7B (in), 8 8B (in), 9 GND (power), 10 Com, 11 8C (oc), 12 7C (oc), 13 6C (oc), 14 5C (oc), 15 4C (oc), 16 3C (oc), 17 2C (oc), 18 1C (oc)

## USB Mini-AB
designator J2
USB MINI B CONNECTOR SMD; Unit P: 5.81; Supplier1 Code: GAY530LX; Supplier1: Avnet
footprint USB Mini_AB (Molex UCB Mini_AB)
pins: 1, 2, 3, 4, 5, 6

## XFMR_0850BM14E0016T
designator TR1, comment 0850BM14E0016
TRANSFORMER, RF, BALUN, 770MHz TO 928MHz, UNBALANCED:50 Ohm, SMD; Vendor Part Status: ACTIVE; Vendor Part Number: 0850BM14E0016T; Part Number: 05-00839; Designed_By: Artur Bielinski; CLASS: IC; Packing Type: TAPE_&_REEL; Packing Size: 4000; Budget Currency: USD; Budget Price: 0.38; Client Status: UNDER_REVIEW; Vendor: JOHANSON TECHNOLOGY; Rtd Power: 2W; Min Oper Temp: -40DEGC; Max Oper Temp: +85DEGC; ALT_SYMBOLS: XFMR_0850BM14E0016_A2L,XFMR_0850BM14E0016_A2M; BU Name: DYNAMIC PRECISION GDANSK; Design_Date: 2016-11-04; AutoDoc File: https://notefied-dynamic-precision.com/DB/Apps/Desktop/Item/Object.aspx?id=115792; Datasheet URL 1: http://www.johansontechnology.com/datasheets/chipset-specific/0850BM14E0016.pdf; RoHS Status: ROHS_COMPLIANT; Frequency: 770MHz TO 928MHz; Rtd Current: N/A; Rtd Voltage: N/A; Part Type: TRANSFORMER\RF; Mounting Type: SMD; PCB Package: N/A; Revision: R001
footprint 0850BM14E0016S (Footprint not found)
pins: 1 UBP, 2 RX/TX, 3 BP_RF_N, 4 BP_RF_P, 5 GND (power), 6 GND (power)

## XTAL
designator Y2
Crystal Oscillator; Published: 8-Jun-2000; LatestRevisionDate: 17-Jul-2002; LatestRevisionNote: Re-released for DXP Platform.; PackageReference: R38; Publisher: Altium Limited
footprint BCY-W2/D3.1 (Crystal, Thru-Hole; 2 Leads; Body 3.1 x 8.2 mm (Dia.xH))
simulation model XTAL (Spice Subcircuit)
footprint CM315 (TUNING FORK  CRYSTAL UNIT)
pins: 1 OSC1, 2 OSC2